# Altium footprint library Connector.PcbLib: 536 footprints (part 30 of 34)
Each footprint in its own frame and in the unit in brackets; x right, y up, seen from the top. Pads: shape width x height; smd on the part's side, far side on the other; paste and mask are expansions set on the pad; w line width, h text height; cw(c..) or ccw(c..) is an arc to the next point about the centre after c.
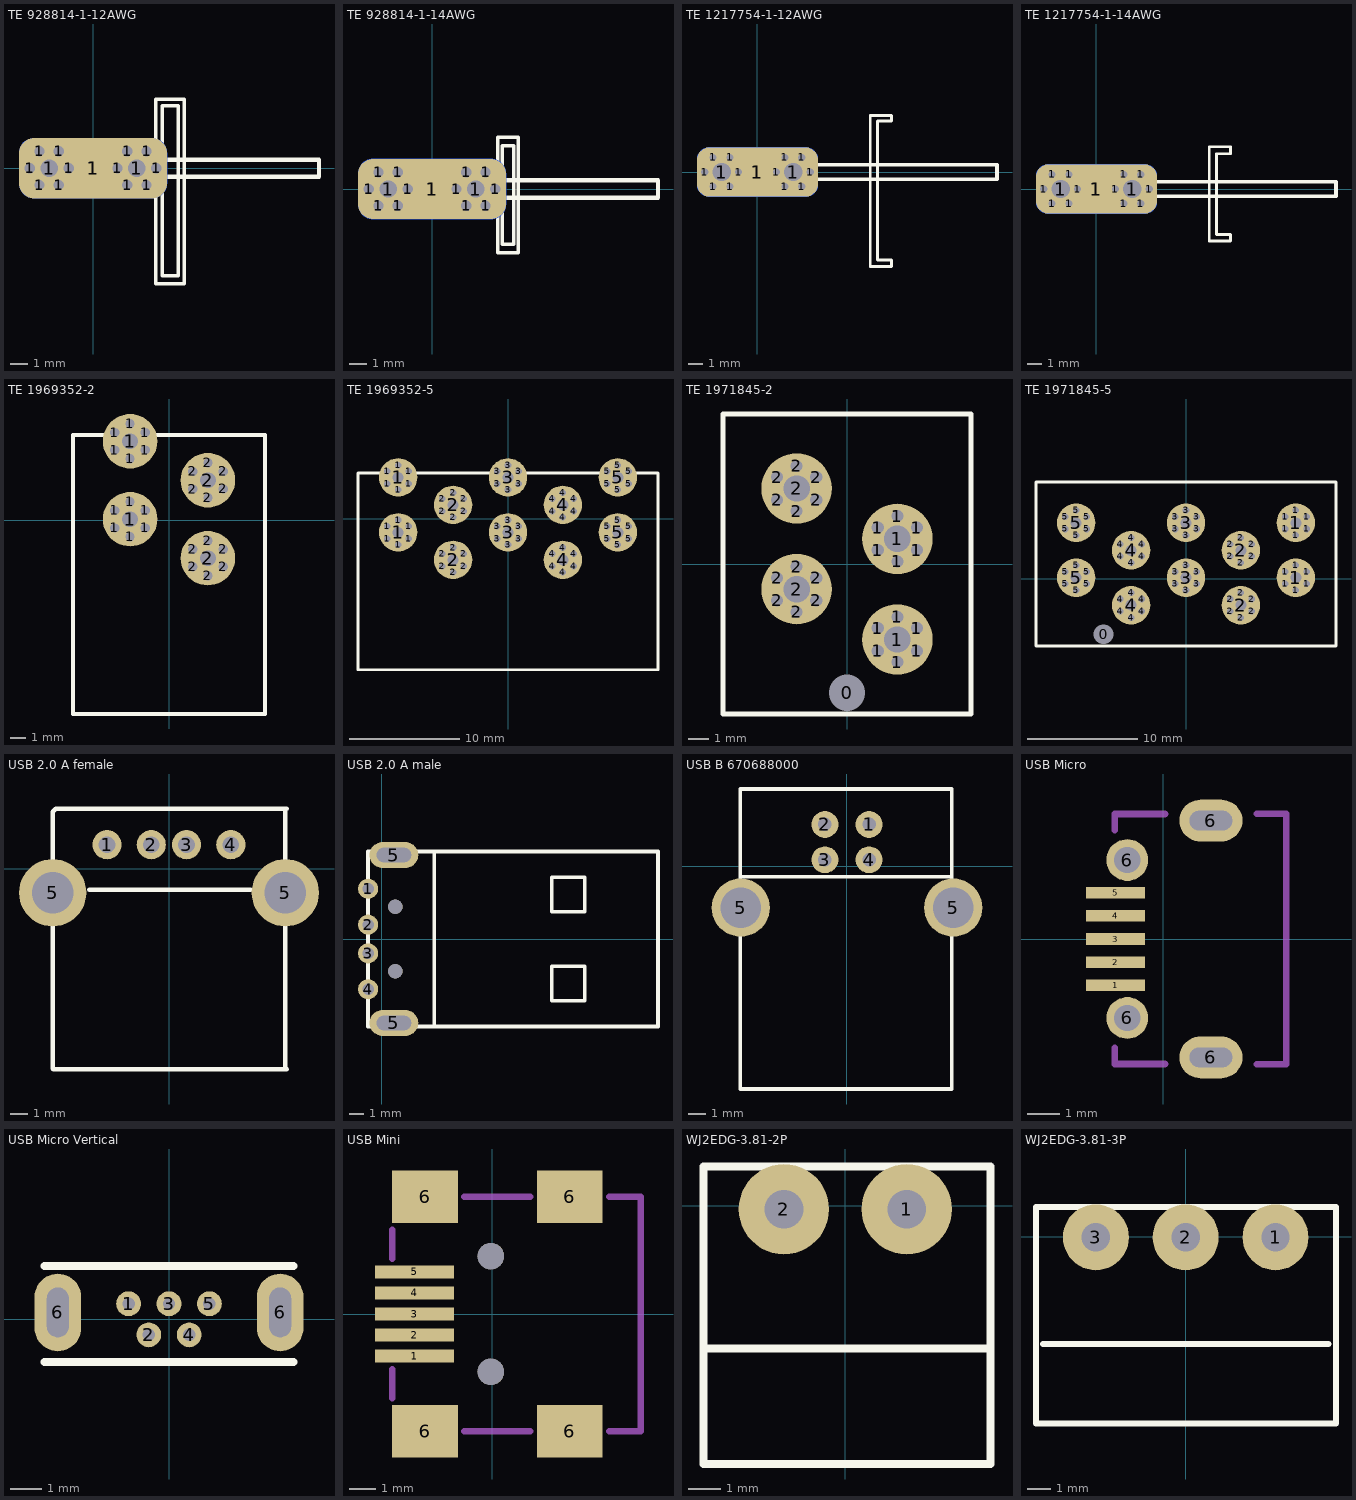
[diagram p29: the footprints below, top view; thin cyan lines are the x and y axes]

## TE 928814-1-12AWG [mm]
pads (16):
  round 1.1 hole 0.6: 1(-3.665,0) 1(-3.103,0.974) 1(-3.102,-0.974) 1(-1.978,0.974) 1(-1.977,-0.974) 1(-1.415,0) 1(1.415,0) 1(1.977,0.974) 1(1.978,-0.974) 1(3.102,0.974) 1(3.103,-0.974) 1(3.665,0)
  round 3.5 hole 1: 1(-2.54,0) 1(2.54,0)
  rrect50% 8.58x3.5 smd: 1(0,0)
  rrect50% 8.58x3.5 smd far side: 1(0,0)
Top Overlay:
  lines w0.203: 3.637,-6.7 5.3,-6.7 5.3,4 3.637,4 3.637,-6.7 ; 4.003,-6.228 4.935,-6.228 4.935,3.627 4.003,3.627 4.003,-6.228
  lines w0.254: 4.004,-0.5 4.004,0.5 ; -2.906,-0.5 -2.906,0.5 13.094,0.5 13.094,-0.5 -2.906,-0.5
3D body "c-928814-1-a-3d.stp": height 7.65, standoff -3.46, extent -2.906,-0.4 13.094,0.4
3D body "c-4-520447-2-k-3d.stp": height 9.43, standoff -0.43, extent 4.004,-6.253 27.766,3.602

## TE 928814-1-14AWG [mm]
pads (16):
  round 1.1 hole 0.6: 1(-3.665,0) 1(-3.103,0.974) 1(-3.102,-0.974) 1(-1.978,0.974) 1(-1.977,-0.974) 1(-1.415,0) 1(1.415,0) 1(1.977,0.974) 1(1.978,-0.974) 1(3.102,0.974) 1(3.103,-0.974) 1(3.665,0)
  round 3.5 hole 1: 1(-2.54,0) 1(2.54,0)
  rrect50% 8.58x3.5 smd: 1(0,0)
  rrect50% 8.58x3.5 smd far side: 1(0,0)
Top Overlay:
  lines w0.203: 4.737,-3.216 4.082,-3.216 4.082,2.502 4.737,2.502 4.737,-3.213 ; 3.815,-3.7 3.815,3 5,3 5,-3.7 3.815,-3.7
  lines w0.254: -2.906,-0.5 13.094,-0.5 13.094,0.5 -2.906,0.5 -2.906,-0.5 ; 4.004,-0.5 4.004,0.5 4.004,-0.5
3D body "3-0520116-2.stp": height 9.24, standoff -0.24, extent 4.082,-3.213 25.799,2.502
3D body "c-928814-1-a-3d.stp": height 7.65, standoff -3.46, extent -2.906,-0.4 13.094,0.4

## TE 1217754-1-12AWG [mm]
pads (16):
  round 1 hole 0.5: 1(-3.74,0) 1(-3.14,1.039) 1(-3.14,-1.039) 1(-1.94,1.039) 1(-1.94,-1.039) 1(-1.34,0) 1(1.34,0) 1(1.94,1.039) 1(1.94,-1.039) 1(3.14,1.039) 1(3.14,-1.039) 1(3.74,0)
  round 3.5 hole 1.3: 1(-2.54,0) 1(2.54,0)
  rrect50% 8.58x3.5 smd: 1(0,0)
  rrect50% 8.58x3.5 smd far side: 1(0,0)
Top Overlay:
  lines w0.203: 8,-6.7 9.5,-6.7 9.5,-6.228 8.5,-6.228 8.5,3.627 9.5,3.627 9.5,4 8,4 8,-6.7
  lines w0.254: 4.004,-0.5 4.004,0.5 ; -2.906,-0.5 -2.906,0.5 16.985,0.5 16.985,-0.5 -2.906,-0.5
3D body "c-1217754-1-d-3d.stp": height 8.93, standoff -3.77, extent -3.34,-0.4 16.98,0.4
3D body "c-4-520447-2-k-3d.stp": height 10.68, standoff 0.82, extent 8.56,-6.246 32.322,3.61

## TE 1217754-1-14AWG [mm]
pads (16):
  round 1 hole 0.5: 1(-3.74,0) 1(-3.14,1.039) 1(-3.14,-1.039) 1(-1.94,1.039) 1(-1.94,-1.039) 1(-1.34,0) 1(1.34,0) 1(1.94,1.039) 1(1.94,-1.039) 1(3.14,1.039) 1(3.14,-1.039) 1(3.74,0)
  round 3.5 hole 1.3: 1(-2.54,0) 1(2.54,0)
  rrect50% 8.58x3.5 smd: 1(0,0)
  rrect50% 8.58x3.5 smd far side: 1(0,0)
Top Overlay:
  lines w0.203: 8,-3.7 8,3 9.5,3 9.5,2.5 8.503,2.5 8.503,-3.218 9.5,-3.218 9.5,-3.7 8,-3.7
  lines w0.254: 4.004,-0.5 4.004,0.5 ; -2.906,-0.5 -2.906,0.5 16.985,0.5 16.985,-0.5 -2.906,-0.5
3D body "c-1217754-1-d-3d.stp": height 8.93, standoff -3.77, extent -3.34,-0.4 16.98,0.4
3D body "3-0520116-2.stp": height 10.49, standoff 1.01, extent 8.503,-3.215 30.22,2.5

## TE 1969352-2 [mm]
pads (28):
  round 1.1 hole 0.6: 1(-3.474,-0.487) 1(-3.474,0.637) 1(-3.474,4.513) 1(-3.474,5.637) 1(-2.5,-1.05) 1(-2.5,1.2) 1(-2.5,3.95) 1(-2.5,6.2) 1(-1.526,-0.487) 1(-1.526,0.638) 1(-1.526,4.513) 1(-1.526,5.638) 2(1.526,-2.987) 2(1.526,-1.863) 2(1.526,2.013) 2(1.526,3.137) 2(2.5,-3.55) 2(2.5,-1.3) 2(2.5,1.45) 2(2.5,3.7) 2(3.474,-2.987) 2(3.474,-1.862) 2(3.474,2.013) 2(3.474,3.138)
  round 3.5 hole 1: 1(-2.5,0.075) 1(-2.5,5.075) 2(2.5,-2.425) 2(2.5,2.575)
Top Overlay:
  lines w0.254: -6.15,-12.425 -6.15,5.475 6.15,5.475 6.15,-12.425 -6.15,-12.425
3D body "c-1969352-2-a-3d.stp": height 16.65, standoff -3.8, extent -6.15,-12.425 6.15,5.475

## TE 1969352-5 [mm]
pads (70):
  round 1.1 hole 0.6: 1(-10.974,-1.813) 1(-10.974,-0.688) 1(-10.974,3.187) 1(-10.974,4.312) 1(-10,-2.375) 1(-10,-0.125) 1(-10,2.625) 1(-10,4.875) 1(-9.026,-1.812) 1(-9.026,-0.687) 1(-9.026,3.188) 1(-9.026,4.313) 2(-5.974,-4.313) 2(-5.974,-3.188) 2(-5.974,0.687) 2(-5.974,1.812) 2(-5,-4.875) 2(-5,-2.625) 2(-5,0.125) 2(-5,2.375) 2(-4.026,-4.312) 2(-4.026,-3.187) 2(-4.026,0.688) 2(-4.026,1.813) 3(-0.974,-1.813) 3(-0.974,-0.688) 3(-0.974,3.187) 3(-0.974,4.312) 3(0,-2.375) 3(0,-0.125) 3(0,2.625) 3(0,4.875) 3(0.974,-1.812) 3(0.974,-0.687) 3(0.974,3.188) 3(0.974,4.313) 4(4.026,-4.313) 4(4.026,-3.188) 4(4.026,0.687) 4(4.026,1.812) 4(5,-4.875) 4(5,-2.625) 4(5,0.125) 4(5,2.375) 4(5.974,-4.312) 4(5.974,-3.187) 4(5.974,0.688) 4(5.974,1.813) 5(9.026,-1.813) 5(9.026,-0.688) 5(9.026,3.187) 5(9.026,4.312) 5(10,-2.375) 5(10,-0.125) 5(10,2.625) 5(10,4.875) 5(10.974,-1.812) 5(10.974,-0.687) 5(10.974,3.188) 5(10.974,4.313)
  round 3.5 hole 1: 1(-10,-1.25) 1(-10,3.75) 2(-5,-3.75) 2(-5,1.25) 3(0,-1.25) 3(0,3.75) 4(5,-3.75) 4(5,1.25) 5(10,-1.25) 5(10,3.75)
Top Overlay:
  lines w0.254: -13.65,-13.75 -13.65,4.15 13.65,4.15 13.65,-13.75 -13.65,-13.75
3D body "c-2-1969352-5-a-3d.stp": height 16.65, standoff -3.8, extent -13.65,-13.75 13.65,4.15

## TE 1971845-2 [mm]
pads (29):
  round 1.7 hole 1.8: 0(0,-6.4)
  round 1.1 hole 0.6: 1(1.526,-4.313) 1(1.526,-3.188) 1(1.526,0.687) 1(1.526,1.812) 1(2.5,-4.875) 1(2.5,-2.625) 1(2.5,0.125) 1(2.5,2.375) 1(3.474,-4.312) 1(3.474,-3.187) 1(3.474,0.688) 1(3.474,1.813) 2(-3.474,-1.813) 2(-3.474,-0.688) 2(-3.474,3.187) 2(-3.474,4.312) 2(-2.5,-2.375) 2(-2.5,-0.125) 2(-2.5,2.625) 2(-2.5,4.875) 2(-1.526,-1.812) 2(-1.526,-0.687) 2(-1.526,3.188) 2(-1.526,4.313)
  round 3.5 hole 1.3: 1(2.5,-3.75) 1(2.5,1.25) 2(-2.5,-1.25) 2(-2.5,3.75)
Top Overlay:
  lines w0.254: -6.15,-7.45 -6.15,7.45 6.15,7.45 6.15,-7.45 -6.15,-7.45
3D body "c-1971845-2-b-3d.stp": height 12.83, standoff -3.47, extent -6.15,-7.475 6.15,7.475

## TE 1971845-5 [mm]
pads (71):
  round 1.7 hole 1.8: 0(-7.5,-5.075)
  round 1.1 hole 0.6: 1(9.026,-0.487) 1(9.026,0.638) 1(9.026,4.513) 1(9.026,5.638) 1(10,-1.05) 1(10,1.2) 1(10,3.95) 1(10,6.2) 1(10.974,-0.487) 1(10.974,0.637) 1(10.974,4.513) 1(10.974,5.637) 2(4.026,-2.987) 2(4.026,-1.862) 2(4.026,2.013) 2(4.026,3.138) 2(5,-3.55) 2(5,-1.3) 2(5,1.45) 2(5,3.7) 2(5.974,-2.987) 2(5.974,-1.863) 2(5.974,2.013) 2(5.974,3.137) 3(-0.974,-0.487) 3(-0.974,0.638) 3(-0.974,4.513) 3(-0.974,5.638) 3(0,-1.05) 3(0,1.2) 3(0,3.95) 3(0,6.2) 3(0.974,-0.487) 3(0.974,0.637) 3(0.974,4.513) 3(0.974,5.637) 4(-5.974,-2.987) 4(-5.974,-1.862) 4(-5.974,2.013) 4(-5.974,3.138) 4(-5,-3.55) 4(-5,-1.3) 4(-5,1.45) 4(-5,3.7) 4(-4.026,-2.987) 4(-4.026,-1.863) 4(-4.026,2.013) 4(-4.026,3.137) 5(-10.974,-0.487) 5(-10.974,0.638) 5(-10.974,4.513) 5(-10.974,5.638) 5(-10,-1.05) 5(-10,1.2) 5(-10,3.95) 5(-10,6.2) 5(-9.026,-0.487) 5(-9.026,0.637) 5(-9.026,4.513) 5(-9.026,5.637)
  round 3.5 hole 1: 1(10,0.075) 1(10,5.075) 2(5,-2.425) 2(5,2.575) 3(0,0.075) 3(0,5.075) 4(-5,-2.425) 4(-5,2.575) 5(-10,0.075) 5(-10,5.075)
Top Overlay:
  lines w0.254: -13.65,-6.125 13.65,-6.125 13.65,8.775 -13.65,8.775 -13.65,-6.125
3D body "c-1971845-5-b-3d.stp": height 12.83, standoff -3.47, extent -13.65,-6.15 13.65,8.8

## USB 2.0 A female [mil] "A型USB接头母头"
pads (6):
  round 65 hole 37: 1(-138,53.5) 2(-39.5,53.5) 3(39,53.5) 4(137.6,53.5)
  round 150 hole 93: 5(-259,-53.5) 5(259,-53.5)
Top Overlay:
  lines w10: -178,-46.5 182,-46.5 ; 259,130.5 259,-53.5 259,-423.5 259,-443.5 262,-446.5 -258,-446.5 -259,-445.5 -259,-53.5 -259,126.5 -252,133.5 262,133.5
3D body "USB-A-S-F-B-TH.STEP": height 293.31, standoff -136.76, extent -310.02,-462.06 312,93.06

## USB 2.0 A male [mm] "USB公头"
pads (8):
  round 1.4 hole 0.8: 1(-0.95,3.5) 2(-0.95,1) 3(-0.95,-1) 4(-0.95,-3.5)
  oval 3.4x1.8 hole 1 slot 2.4 at 0 deg: 5(0.85,-5.85) 5(0.85,5.85)
  round 1 hole 1 unplated: ""(0.95,-2.245) ""(0.95,2.245)
Top Overlay:
  lines w0.254: 3.65,-6.1 3.65,6.1 ; -0.95,-6.1 -0.95,6.1 19.25,6.1 19.25,-6.1 -0.95,-6.1 ; 11.85,-4.3 14.15,-4.3 14.15,-1.9 11.85,-1.9 11.85,-4.3 ; 11.85,1.9 11.85,4.3 14.15,4.3 14.15,1.9 11.85,1.9
3D body "USB-AM-S-F-B-TH.STEP": height 3.52, standoff -2.18, extent -1.283,-6.25 18.747,6.25

## USB B 670688000 [mm] "B型USB母头"
pads (6):
  round 1.524 hole 0.762: 1(1.25,2.355) 2(-1.25,2.355) 3(-1.25,0.355) 4(1.25,0.355)
  round 3.3 hole 2.3: 5(-6.02,-2.355) 5(6.02,-2.355)
Top Overlay:
  lines w0.2: -6.057,-0.615 5.943,-0.615 ; -6.057,-12.635 5.943,-12.635 5.943,4.365 -6.057,4.365 -6.057,-12.635
3D body "Molex USB_B 670688000.stp": height 11, standoff -4.22, extent -7.487,-12.635 7.373,4.365

## USB Micro [mm]
pads (9):
  rect 1.8x0.35 smd: 1(-1.45,-1.4) 2(-1.45,-0.7) 3(-1.45,0) 4(-1.45,0.7) 5(-1.45,1.4)
  round 1.27 hole 0.8: 6(-1.09,-2.4) 6(-1.09,2.4)
  oval 1.92x1.27 hole 0.6 slot 1.3 at 0 deg: 6(1.45,-3.6) 6(1.45,3.6)
Mechanical 15:
  lines w0.203: -1.471,-3.302 -1.471,-3.8 0.053,-3.8 ; -1.471,3.302 -1.471,3.8 0.053,3.8 ; 2.847,-3.81 3.736,-3.81 3.736,3.81 2.847,3.81
3D body "MicroUSB-B.STEP": height 2.98, standoff -0.33, extent -1.327,-4.1 4.103,4.1

## USB Micro Vertical [mm]
pads (7):
  round 0.8 hole 0.4: 1(-1.3,0.5) 2(-0.65,-0.5) 3(0,0.5) 4(0.65,-0.5) 5(1.3,0.5)
  oval 1.5x2.5 hole 0.7 slot 1.6 at 90 deg: 6(-3.575,0.22) 6(3.575,0.22)
Top Overlay:
  lines w0.254: -4,-1.38 4,-1.38 ; -4,1.719 4,1.719
3D body: height 0.06, standoff -1.54, extent 3.449,0.374 3.699,0.623
3D body: height 0.06, standoff -1.54, extent 3.45,0.249 3.7,0.499
3D body: height 0.06, standoff -1.54, extent 3.45,0.125 3.7,0.374
3D body: height 0.06, standoff -1.54, extent 3.45,0 3.7,0.25
3D body: height 0.06, standoff -1.54, extent 3.45,-0.125 3.7,0.125
3D body: height 0.06, standoff -1.54, extent 3.45,-0.249 3.7,0
3D body: height 0.06, standoff -1.54, extent 3.451,-0.374 3.701,-0.124
3D body: height 0.06, standoff -1.54, extent 3.451,-0.498 3.701,-0.249
3D body: height 0.06, standoff -1.54, extent 3.451,-0.623 3.701,-0.373
3D body: height 0.06, standoff -1.54, extent -3.701,0.374 -3.451,0.623
3D body: height 0.06, standoff -1.54, extent -3.7,0.249 -3.45,0.499
3D body: height 0.06, standoff -1.54, extent -3.7,0.125 -3.45,0.374
3D body: height 0.06, standoff -1.54, extent -3.7,0 -3.45,0.25
3D body: height 0.06, standoff -1.54, extent -3.7,-0.125 -3.45,0.125
3D body: height 0.06, standoff -1.54, extent -3.7,-0.249 -3.45,0
3D body: height 0.06, standoff -1.54, extent -3.699,-0.374 -3.449,-0.124
3D body: height 0.06, standoff -1.54, extent -3.699,-0.498 -3.449,-0.249
3D body: height 0.06, standoff -1.54, extent -3.699,-0.623 -3.449,-0.373
3D body: height 0.06, standoff -1.54, extent -1.425,0.375 -1.175,0.625
3D body: height 0.06, standoff -1.54, extent -0.9,-0.75 -0.4,-0.25
3D body: height 0.06, standoff -1.54, extent 0.4,-0.75 0.9,-0.25
3D body: height 0.06, standoff -1.54, extent -0.25,0.25 0.25,0.75
3D body: height 0.06, standoff -1.54, extent 1.05,0.25 1.55,0.75
3D body: height 5.61, standoff 0, extent -4,-1.38 4,1.719

## USB Mini [mm] "B型迷你USB接头"
pads (11):
  rect 3x0.5 smd: 1(-2.95,-1.6) 2(-2.95,-0.8) 3(-2.95,0) 4(-2.95,0.8) 5(-2.95,1.6)
  rect 2.5x2 smd: 6(-2.55,-4.45) 6(-2.55,4.45) 6(2.95,-4.45) 6(2.95,4.45)
  round 1 hole 1 unplated: ""(-0.05,-2.2) ""(-0.05,2.2)
Mechanical 15:
  lines w0.254: -3.8,-3.2 -3.8,-2.1 ; -3.8,2.1 -3.8,3.2 ; -1.05,-4.45 1.45,-4.45 ; -1.05,4.45 1.45,4.45 ; 4.45,-4.45 5.65,-4.45 5.65,4.45 4.45,4.45
3D body "usb_a-usb_b-m5-smd-c.stp": height 3.93, standoff -1, extent -3.403,-5.077 5.847,4.823

## WJ2EDG-3.81-2P [mm]
height 7
pads (2):
  round 2.8 hole 1.2: 1(1.905,-0.102) 2(-1.905,-0.102)
Top Overlay:
  lines w0.254: -4.318,-4.42 4.414,-4.42 ; -4.394,-8.001 -4.394,1.219 4.496,1.219 4.496,-8.001 -4.394,-8.001
3D body "User Library-1803277.step": height 7.45, standoff -3.2, extent -4.454,-8.055 4.556,1.245

## WJ2EDG-3.81-3P [mm]
height 7
pads (3):
  round 2.8 hole 1.2: 1(3.81,-0.025) 2(0,-0.025) 3(-3.81,-0.025)
Top Overlay:
  lines w0.254: -6.045,-4.547 6.065,-4.547 ; -6.35,-7.93 6.375,-7.93 6.375,1.27 -6.35,1.27 -6.35,-7.93
3D body "User Library-1803280.step": height 7.25, standoff -3.4, extent -6.401,-8.003 6.419,1.297